# Altium footprint library hphonglib.PcbLib: 703 footprints (part 23 of 44)
Each footprint in its own frame and in the unit in brackets; x right, y up, seen from the top. Pads: shape width x height; smd on the part's side, far side on the other; paste and mask are expansions set on the pad; w line width, h text height; cw(c..) or ccw(c..) is an arc to the next point about the centre after c.
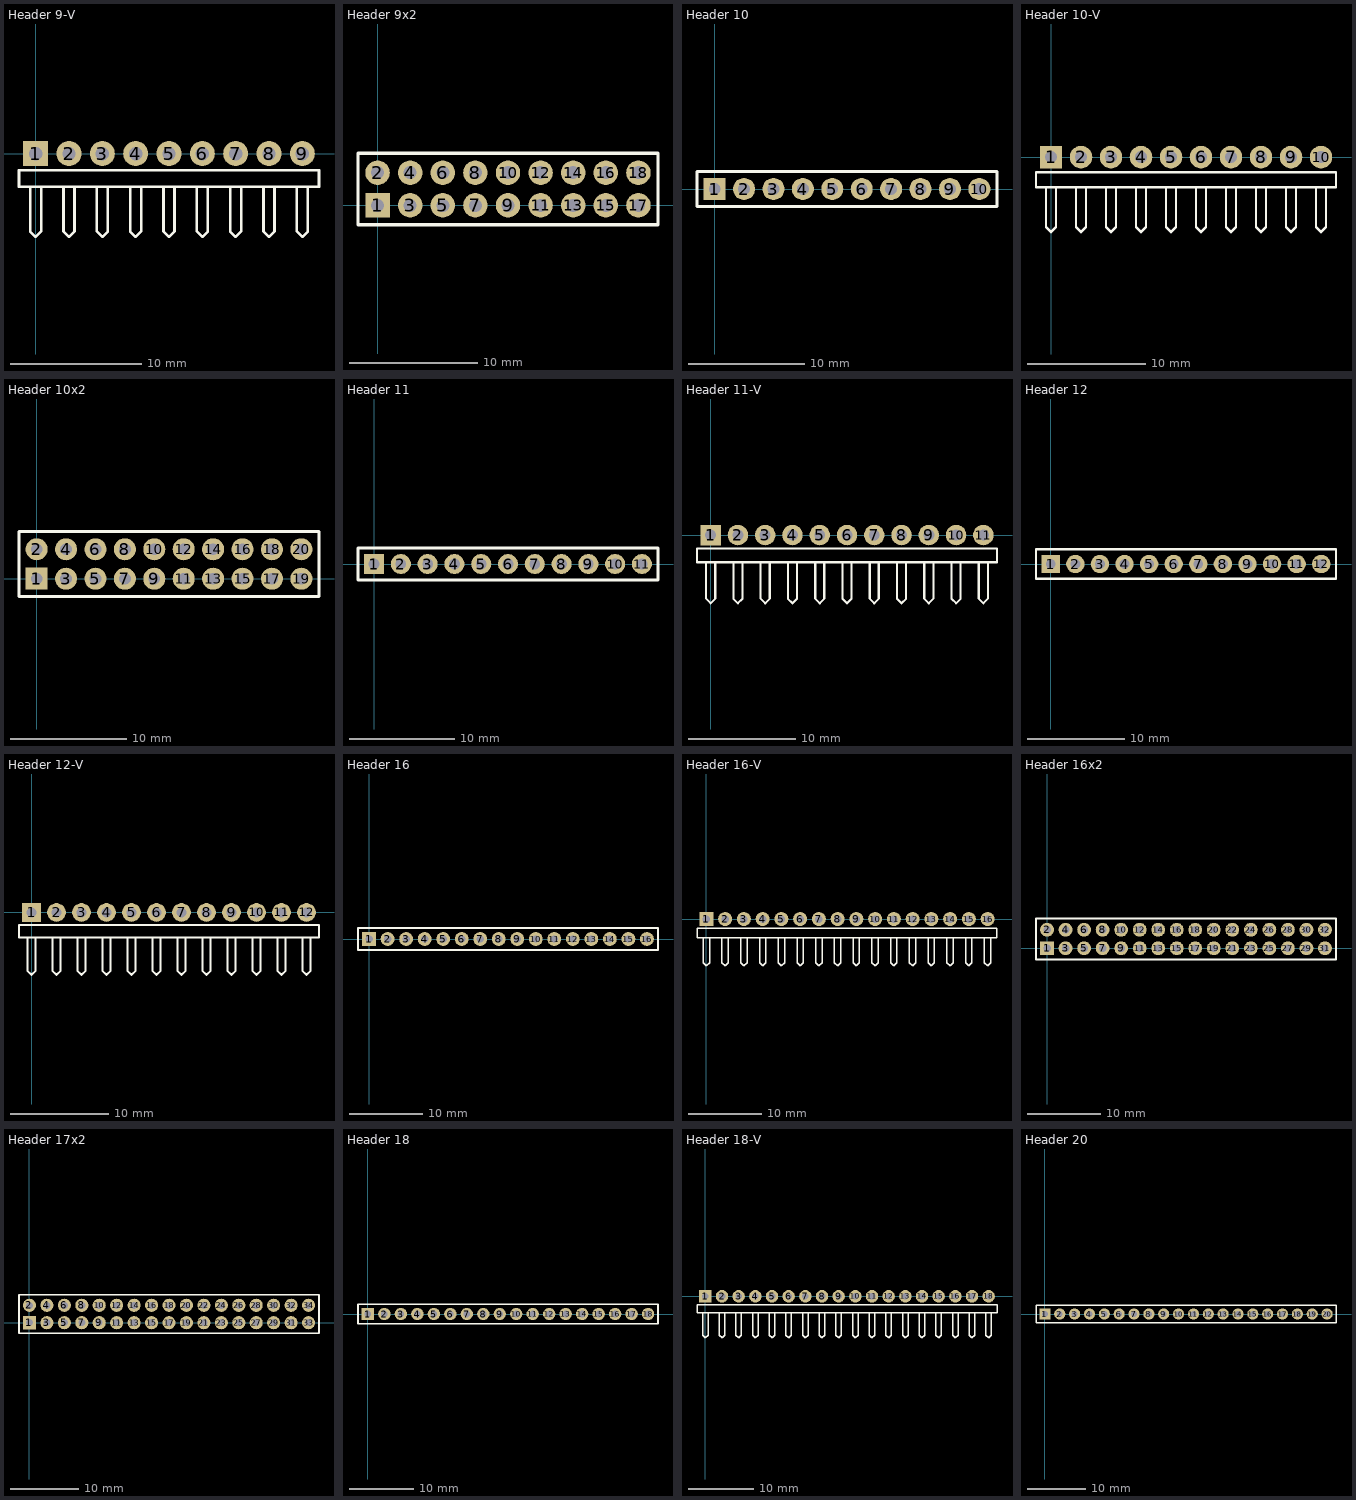
[diagram p22: the footprints below, top view; thin cyan lines are the x and y axes]

## Header 9-V [mil] "Connector; Header; 9 Position; Vertical; Solder Pad 35mil"
pads (9):
  rect 75x75 hole 40: 1(0,0)
  round 75 hole 40: 2(100,0) 3(200,0) 4(300,0) 5(400,0) 6(500,0) 7(600,0) 8(700,0) 9(800,0)
Top Overlay:
  lines w7.87: -16.67,-100 -16.67,-233.33 0,-250 16.67,-233.33 16.67,-100 ; 83.33,-100 83.33,-233.33 100,-250 116.67,-233.33 116.67,-100 ; 183.33,-100 183.33,-233.33 200,-250 216.67,-233.33 216.67,-100 ; 283.33,-100 283.33,-233.33 300,-250 316.67,-233.33 316.67,-100 ; 383.33,-100 383.33,-233.33 400,-250 416.67,-233.33 416.67,-100 ; 483.33,-100 483.33,-233.33 500,-250 516.67,-233.33 516.67,-100 ; 583.33,-100 583.33,-233.33 600,-250 616.67,-233.33 616.67,-100 ; 683.33,-100 683.33,-233.33 700,-250 716.66,-233.33 716.66,-100 ; 783.33,-100 783.33,-233.33 800,-250 816.66,-233.33 816.66,-100 ; -50,-100 850,-100 850,-50 -50,-50 -50,-100
3D body: height 171.28, standoff -117.11, extent -50,-275.59 850,50

## Header 9x2 [mil] "Connector; Header; 18 Position; 2 Rows; Solder Pad 35mil"
pads (18):
  rect 75x75 hole 40: 1(0,0)
  round 75 hole 40: 2(0,100) 3(100,0) 4(100,100) 5(200,0) 6(200,100) 7(300,0) 8(300,100) 9(400,0) 10(400,100) 11(500,0) 12(500,100) 13(600,0) 14(600,100) 15(700,0) 16(700,100) 17(800,0) 18(800,100)
Top Overlay:
  lines w10: -60,-60 860,-60 860,160 -60,160 -60,-60
3D body: height 330, standoff -100, extent -50,-49.99 850,150.01

## Header 10 [mil] "Connector; Header; 10 Position; Solder Pad 35mil"
pads (10):
  rect 75x75 hole 40: 1(0,0)
  round 75 hole 40: 2(100,0) 3(200,0) 4(300,0) 5(400,0) 6(500,0) 7(600,0) 8(700,0) 9(800,0) 10(900,0)
Top Overlay:
  lines w10: -60,-60 -60,60 960,60 960,-60 -60,-60
3D body: height 330, standoff -100, extent -49.99,-49.99 950.01,50.01

## Header 10-V [mil] "Connector; Header; 10 Position; Vertical; Solder Pad 35mil"
pads (10):
  rect 75x75 hole 40: 1(0,0)
  round 75 hole 40: 2(100,0) 3(200,0) 4(300,0) 5(400,0) 6(500,0) 7(600,0) 8(700,0) 9(800,0) 10(900,0)
Top Overlay:
  lines w7.87: -16.67,-100 -16.67,-233.33 0,-250 16.67,-233.33 16.67,-100 ; 83.33,-100 83.33,-233.33 100,-250 116.67,-233.33 116.67,-100 ; 183.33,-100 183.33,-233.33 200,-250 216.67,-233.33 216.67,-100 ; 283.33,-100 283.33,-233.33 300,-250 316.67,-233.33 316.67,-100 ; 383.33,-100 383.33,-233.33 400,-250 416.67,-233.33 416.67,-100 ; 483.33,-100 483.33,-233.33 500,-250 516.67,-233.33 516.67,-100 ; 583.33,-100 583.33,-233.33 600,-250 616.67,-233.33 616.67,-100 ; 683.33,-100 683.33,-233.33 700,-250 716.66,-233.33 716.66,-100 ; 783.33,-100 783.33,-233.33 800,-250 816.66,-233.33 816.66,-100 ; 883.33,-100 883.33,-233.33 900,-250 916.66,-233.33 916.66,-100 ; -50,-100 -50,-50 950,-50 950,-100 -50,-100
3D body: height 171.28, standoff -117.11, extent -50,-275.59 950,50

## Header 10x2 [mil] "Connector; Header; 20 Position; 2 Rows; Solder Pad 35mil"
pads (20):
  rect 75x75 hole 40: 1(0,0)
  round 75 hole 40: 2(0,100) 3(100,0) 4(100,100) 5(200,0) 6(200,100) 7(300,0) 8(300,100) 9(400,0) 10(400,100) 11(500,0) 12(500,100) 13(600,0) 14(600,100) 15(700,0) 16(700,100) 17(800,0) 18(800,100) 19(900,0) 20(900,100)
Top Overlay:
  lines w10: -60,-60 -60,160 960,160 960,-60 -60,-60
3D body: height 330, standoff -100, extent -50,-49.99 950,150.01

## Header 11 [mil] "Connector; Header; 11 Position; Solder Pad 35mil"
pads (11):
  rect 75x75 hole 40: 1(0,0)
  round 75 hole 40: 2(100,0) 3(200,0) 4(300,0) 5(400,0) 6(500,0) 7(600,0) 8(700,0) 9(800,0) 10(900,0) 11(1000,0)
Top Overlay:
  lines w10: -60,-60 1060,-60 1060,60 -60,60 -60,-60
3D body: height 330, standoff -100, extent -49.99,-50 1050.01,50

## Header 11-V [mil] "Connector; Header; 11 Position; Vertical; Solder Pad 35mil"
pads (11):
  rect 75x75 hole 40: 1(0,0)
  round 75 hole 40: 2(100,0) 3(200,0) 4(300,0) 5(400,0) 6(500,0) 7(600,0) 8(700,0) 9(800,0) 10(900,0) 11(1000,0)
Top Overlay:
  lines w7.87: -16.67,-100 -16.67,-233.33 0,-250 16.67,-233.33 16.67,-100 ; 83.33,-100 83.33,-233.33 100,-250 116.67,-233.33 116.67,-100 ; 183.33,-100 183.33,-233.33 200,-250 216.67,-233.33 216.67,-100 ; 283.33,-100 283.33,-233.33 300,-250 316.67,-233.33 316.67,-100 ; 383.33,-100 383.33,-233.33 400,-250 416.67,-233.33 416.67,-100 ; 483.33,-100 483.33,-233.33 500,-250 516.67,-233.33 516.67,-100 ; 583.33,-100 583.33,-233.33 600,-250 616.67,-233.33 616.67,-100 ; 683.33,-100 683.33,-233.33 700,-250 716.66,-233.33 716.66,-100 ; 783.33,-100 783.33,-233.33 800,-250 816.66,-233.33 816.66,-100 ; 883.33,-100 883.33,-233.33 900,-250 916.66,-233.33 916.66,-100 ; 983.33,-100 983.33,-233.33 1000,-250 1016.66,-233.33 1016.66,-100 ; -50,-100 1050,-100 1050,-50 -50,-50 -50,-100
3D body: height 171.28, standoff -117.11, extent -50,-275.59 1050,50

## Header 12 [mil] "Connector; Header; 12 Position; Solder Pad 35mil"
pads (12):
  rect 75x75 hole 40: 1(0,0)
  round 75 hole 40: 2(100,0) 3(200,0) 4(300,0) 5(400,0) 6(500,0) 7(600,0) 8(700,0) 9(800,0) 10(900,0) 11(1000,0) 12(1100,0)
Top Overlay:
  lines w10: -60,-60 1160,-60 1160,60 -60,60 -60,-60
3D body: height 330, standoff -100, extent -50,-50 1150,50

## Header 12-V [mil] "Connector; Header; 12 Position; Vertical; Solder Pad 35mil"
pads (12):
  rect 75x75 hole 40: 1(0,0)
  round 75 hole 40: 2(100,0) 3(200,0) 4(300,0) 5(400,0) 6(500,0) 7(600,0) 8(700,0) 9(800,0) 10(900,0) 11(1000,0) 12(1100,0)
Top Overlay:
  lines w7.87: -16.67,-100 -16.67,-233.33 0,-250 16.67,-233.33 16.67,-100 ; 83.33,-100 83.33,-233.33 100,-250 116.67,-233.33 116.67,-100 ; 183.33,-100 183.33,-233.33 200,-250 216.67,-233.33 216.67,-100 ; 283.33,-100 283.33,-233.33 300,-250 316.67,-233.33 316.67,-100 ; 383.33,-100 383.33,-233.33 400,-250 416.67,-233.33 416.67,-100 ; 483.33,-100 483.33,-233.33 500,-250 516.67,-233.33 516.67,-100 ; 583.33,-100 583.33,-233.33 600,-250 616.67,-233.33 616.67,-100 ; 683.33,-100 683.33,-233.33 700,-250 716.66,-233.33 716.66,-100 ; 783.33,-100 783.33,-233.33 800,-250 816.66,-233.33 816.66,-100 ; 883.33,-100 883.33,-233.33 900,-250 916.66,-233.33 916.66,-100 ; 983.33,-100 983.33,-233.33 1000,-250 1016.66,-233.33 1016.66,-100 ; 1083.33,-100 1083.33,-233.33 1100,-250 1116.66,-233.33 1116.66,-100 ; -50,-100 1150,-100 1150,-50 -50,-50 -50,-100
3D body: height 171.28, standoff -117.11, extent -50,-275.59 1150,50

## Header 16 [mil] "Connector; Header; 16 Position; Solder Pad 35mil"
pads (16):
  rect 75x75 hole 40: 1(0,0)
  round 75 hole 40: 2(100,0) 3(200,0) 4(300,0) 5(400,0) 6(500,0) 7(600,0) 8(700,0) 9(800,0) 10(900,0) 11(1000,0) 12(1100,0) 13(1200,0) 14(1300,0) 15(1400,0) 16(1500,0)
Top Overlay:
  lines w10: -60,-60 1560,-60 1560,60 -60,60 -60,-60
3D body: height 330, standoff -100, extent -49.99,-50 1550.01,50

## Header 16-V [mil] "Connector; Header; 16 Position; Vertical; Solder Pad 35mil"
pads (16):
  rect 75x75 hole 40: 1(0,0)
  round 75 hole 40: 2(100,0) 3(200,0) 4(300,0) 5(400,0) 6(500,0) 7(600,0) 8(700,0) 9(800,0) 10(900,0) 11(1000,0) 12(1100,0) 13(1200,0) 14(1300,0) 15(1400,0) 16(1500,0)
Top Overlay:
  lines w7.87: -16.67,-100 -16.67,-233.33 0,-250 16.67,-233.33 16.67,-100 ; 83.33,-100 83.33,-233.33 100,-250 116.67,-233.33 116.67,-100 ; 183.33,-100 183.33,-233.33 200,-250 216.67,-233.33 216.67,-100 ; 283.33,-100 283.33,-233.33 300,-250 316.67,-233.33 316.67,-100 ; 383.33,-100 383.33,-233.33 400,-250 416.67,-233.33 416.67,-100 ; 483.33,-100 483.33,-233.33 500,-250 516.67,-233.33 516.67,-100 ; 583.33,-100 583.33,-233.33 600,-250 616.67,-233.33 616.67,-100 ; 683.33,-100 683.33,-233.33 700,-250 716.66,-233.33 716.66,-100 ; 783.33,-100 783.33,-233.33 800,-250 816.66,-233.33 816.66,-100 ; 883.33,-100 883.33,-233.33 900,-250 916.66,-233.33 916.66,-100 ; 983.33,-100 983.33,-233.33 1000,-250 1016.66,-233.33 1016.66,-100 ; 1083.33,-100 1083.33,-233.33 1100,-250 1116.66,-233.33 1116.66,-100 ; 1183.33,-100 1183.33,-233.33 1200,-250 1216.66,-233.33 1216.66,-100 ; 1283.33,-100 1283.33,-233.33 1300,-250 1316.66,-233.33 1316.66,-100 ; 1383.33,-100 1383.33,-233.33 1400,-250 1416.66,-233.33 1416.66,-100 ; 1483.33,-99.99 1483.33,-233.33 1499.99,-249.99 1516.66,-233.33 1516.66,-99.99 ; -50,-100 -50,-50 1550,-50 1550,-100 -50,-100
3D body: height 171.28, standoff -117.11, extent -50,-275.59 1550,50

## Header 16x2 [mil] "Connector; Header; 32 Position; 2 Rows; Solder Pad 35mil"
pads (32):
  rect 75x75 hole 40: 1(0,0)
  round 75 hole 40: 2(0,100) 3(100,0) 4(100,100) 5(200,0) 6(200,100) 7(300,0) 8(300,100) 9(400,0) 10(400,100) 11(500,0) 12(500,100) 13(600,0) 14(600,100) 15(700,0) 16(700,100) 17(800,0) 18(800,100) 19(900,0) 20(900,100) 21(1000,0) 22(1000,100) 23(1100,0) 24(1100,100) 25(1200,0) 26(1200,100) 27(1300,0) 28(1300,100) 29(1400,0) 30(1400,100) 31(1500,0) 32(1500,100)
Top Overlay:
  lines w10: -60,-60 1560,-60 1560,160 -60,160 -60,-60
3D body: height 330, standoff -100, extent -49.99,-49.99 1550.01,150.01

## Header 17x2 [mil] "Connector; Header; 34 Position; 2 Rows; Solder Pad 35mil"
pads (34):
  rect 75x75 hole 40: 1(0,0)
  round 75 hole 40: 2(0,100) 3(100,0) 4(100,100) 5(200,0) 6(200,100) 7(300,0) 8(300,100) 9(400,0) 10(400,100) 11(500,0) 12(500,100) 13(600,0) 14(600,100) 15(700,0) 16(700,100) 17(800,0) 18(800,100) 19(900,0) 20(900,100) 21(1000,0) 22(1000,100) 23(1100,0) 24(1100,100) 25(1200,0) 26(1200,100) 27(1300,0) 28(1300,100) 29(1400,0) 30(1400,100) 31(1500,0) 32(1500,100) 33(1600,0) 34(1600,100)
Top Overlay:
  lines w10: -60,-60 -60,160 1660,160 1660,-60 -60,-60
3D body: height 330, standoff -100, extent -49.99,-49.99 1650.01,150.01

## Header 18 [mil] "Connector; Header; 18 Position; Solder Pad 35mil"
pads (18):
  rect 75x75 hole 40: 1(0,0)
  round 75 hole 40: 2(100,0) 3(200,0) 4(300,0) 5(400,0) 6(500,0) 7(600,0) 8(700,0) 9(800,0) 10(900,0) 11(1000,0) 12(1100,0) 13(1200,0) 14(1300,0) 15(1400,0) 16(1500,0) 17(1600,0) 18(1700,0)
Top Overlay:
  lines w10: -60,-60 1760,-60 1760,60 -60,60 -60,-60
3D body: height 330, standoff -100, extent -49.99,-49.99 1750.01,50.01

## Header 18-V [mil] "Connector; Header; 18 Position; Vertical; Solder Pad 35mil"
pads (18):
  rect 75x75 hole 40: 1(0,0)
  round 75 hole 40: 2(100,0) 3(200,0) 4(300,0) 5(400,0) 6(500,0) 7(600,0) 8(700,0) 9(800,0) 10(900,0) 11(1000,0) 12(1100,0) 13(1200,0) 14(1300,0) 15(1400,0) 16(1500,0) 17(1600,0) 18(1700,0)
Top Overlay:
  lines w7.87: -16.67,-100 -16.67,-233.33 0,-250 16.67,-233.33 16.67,-100 ; 83.33,-100 83.33,-233.33 100,-250 116.67,-233.33 116.67,-100 ; 183.33,-100 183.33,-233.33 200,-250 216.67,-233.33 216.67,-100 ; 283.33,-100 283.33,-233.33 300,-250 316.67,-233.33 316.67,-100 ; 383.33,-100 383.33,-233.33 400,-250 416.67,-233.33 416.67,-100 ; 483.33,-100 483.33,-233.33 500,-250 516.67,-233.33 516.67,-100 ; 583.33,-100 583.33,-233.33 600,-250 616.67,-233.33 616.67,-100 ; 683.33,-100 683.33,-233.33 700,-250 716.66,-233.33 716.66,-100 ; 783.33,-100 783.33,-233.33 800,-250 816.66,-233.33 816.66,-100 ; 883.33,-100 883.33,-233.33 900,-250 916.66,-233.33 916.66,-100 ; 983.33,-100 983.33,-233.33 1000,-250 1016.66,-233.33 1016.66,-100 ; 1083.33,-100 1083.33,-233.33 1100,-250 1116.66,-233.33 1116.66,-100 ; 1183.33,-100 1183.33,-233.33 1200,-250 1216.66,-233.33 1216.66,-100 ; 1283.33,-100 1283.33,-233.33 1300,-250 1316.66,-233.33 1316.66,-100 ; 1383.33,-100 1383.33,-233.33 1400,-250 1416.66,-233.33 1416.66,-100 ; 1483.33,-99.99 1483.33,-233.33 1499.99,-249.99 1516.66,-233.33 1516.66,-99.99 ; 1583.33,-99.99 1583.33,-233.33 1599.99,-249.99 1616.66,-233.33 1616.66,-99.99 ; 1683.33,-99.99 1683.33,-233.33 1699.99,-249.99 1716.66,-233.33 1716.66,-99.99 ; -50,-100 1750,-100 1750,-50 -50,-50 -50,-100
3D body: height 171.28, standoff -117.11, extent -50,-275.59 1750,50

## Header 20 [mil] "Connector; Header; 20 Position; Solder Pad 35mil"
pads (20):
  rect 75x75 hole 40: 1(0,0)
  round 75 hole 40: 2(100,0) 3(200,0) 4(300,0) 5(400,0) 6(500,0) 7(600,0) 8(700,0) 9(800,0) 10(900,0) 11(1000,0) 12(1100,0) 13(1200,0) 14(1300,0) 15(1400,0) 16(1500,0) 17(1600,0) 18(1700,0) 19(1800,0) 20(1900,0)
Top Overlay:
  lines w10: -60,-60 1960,-60 1960,60 -60,60 -60,-60
3D body: height 330, standoff -100, extent -50,-49.99 1950,50.01